# Altium footprint library SparkFun.PCBLIB: 674 footprints (part 26 of 44)
Each footprint in its own frame and in the unit in brackets; x right, y up, seen from the top. Pads: shape width x height; smd on the part's side, far side on the other; paste and mask are expansions set on the pad; w line width, h text height; cw(c..) or ccw(c..) is an arc to the next point about the centre after c.
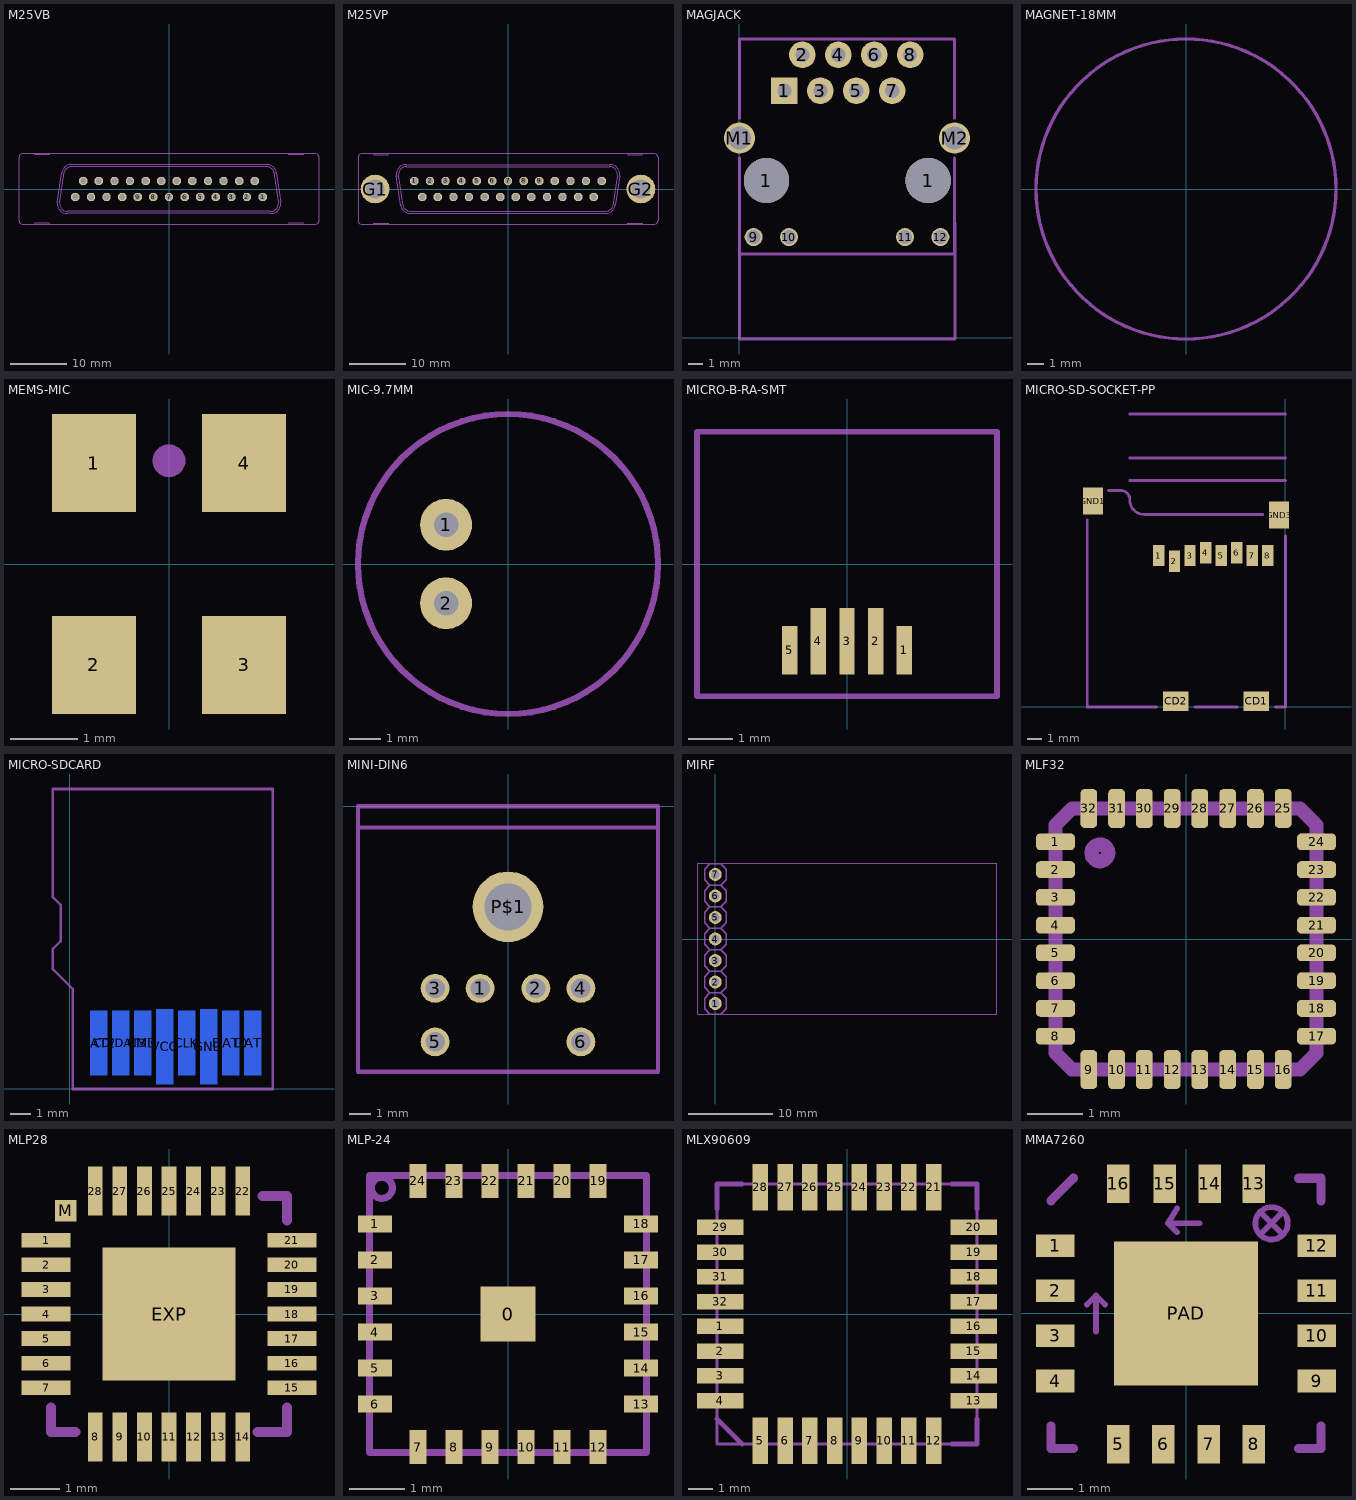
[diagram p25: the footprints below, top view; thin cyan lines are the x and y axes]

## M25VB [mil]
pads (25):
  oct 58.09x58.09 hole 40: 1(652,-56) 2(543,-56) 3(435,-56) 4(326,-56) 5(217,-56) 6(109,-56) 7(0,-56) 8(-109,-56) 9(-217,-56) 10(-326,-56) 11(-435,-56) 12(-543,-56) 13(-652,-56) 14(598,56) 15(489,56) 16(380,56) 17(272,56) 18(163,56) 19(54,56) 20(-54,56) 21(-163,56) 22(-272,56) 23(-380,56) 24(-489,56) 25(-598,56)
Mechanical 2:
  lines w6: -777,-91 -747,113 ; -776.69,-88.67 ccw(c-710,-101.99) -710,-170 710,-170 ccw(c710,-102) 776.68,-88.67 ; -762,-91 -731,115 ; -761.79,-90.7 ccw(c-710,-101.99) -710,-155 710,-155 ccw(c710,-102) 761.97,-91.61 ; -747.89,105.7 cw(c-679.99,102) -680,170 680,170 cw(c680,102) 747.4,110.99 ; -731.52,114.37 cw(c-679.99,102) -680,155 680,155 cw(c680,101.99) 731.3,115.33 ; 731,116 762,-92 ; 746,116 777,-92 ; -935,-245 -1020,-245 cw(c-1020,-220) -1045,-220 -1045,220 cw(c-1020,220) -1020,245 -935,245 ; -935,-245 -935,-240 -835,-240 -835,-245 ; -935,-245 -835,-245 ; -935,245 -835,245 ; -935,245 -935,240 -835,240 -835,245 ; -835,-245 835,-245 ; -835,245 835,245 ; 835,-245 835,-240 935,-240 935,-245 ; 835,-245 935,-245 ; 835,245 935,245 ; 835,245 835,240 935,240 935,245 ; 935,-245 1020,-245 ccw(c1020,-220) 1045,-220 1045,220 ccw(c1020,220) 1020,245 935,245
Mechanical 18:
  circle w16: c109,-56 r10
  circle w16: c163,56 r10
  circle w16: c217,-56 r10
  circle w16: c0,-56 r10
  circle w16: c54,56 r10
  circle w16: c-54,56 r10
  circle w16: c-109,-56 r10
  circle w16: c-217,-56 r10
  circle w16: c-163,56 r10
  circle w16: c-272,56 r10
  circle w16: c-326,-56 r10
  circle w16: c-380,56 r10
  circle w16: c-435,-56 r10
  circle w16: c-489,56 r10
  circle w16: c-543,-56 r10
  circle w16: c-652,-56 r10
  circle w16: c-598,56 r10
  circle w16: c326,-56 r10
  circle w16: c272,56 r10
  circle w16: c380,56 r10
  circle w16: c435,-56 r10
  circle w16: c543,-56 r10
  circle w16: c652,-56 r10
  circle w16: c489,56 r10
  circle w16: c598,56 r10

## M25VP [mil]
pads (27):
  oct 58.09x58.09 hole 40: 1(-652,56) 2(-543,56) 3(-435,56) 4(-326,56) 5(-217,56) 6(-109,56) 7(0,56) 8(109,56) 9(217,56) 10(326,56) 11(435,56) 12(543,56) 13(652,56) 14(-598,-56) 15(-489,-56) 16(-380,-56) 17(-272,-56) 18(-163,-56) 19(-54,-56) 20(54,-56) 21(163,-56) 22(272,-56) 23(380,-56) 24(489,-56) 25(598,-56)
  round 200 hole 130: G1(-926,0) G2(926,0)
Mechanical 2:
  circle w6: c-926,-1 r65
  circle w6: c926,0 r65
  lines w6: -777,92 -746,-116 ; -776.68,88.67 cw(c-710,102) -710,170 710,170 cw(c710,101.99) 776.69,88.67 ; -762,92 -731,-116 ; -761.97,91.61 cw(c-710,102) -710,155 710,155 cw(c710,101.99) 761.79,90.7 ; -747.4,-110.99 ccw(c-680,-102) -680,-170 680,-170 ccw(c679.99,-102) 747.89,-105.7 ; -731.3,-115.33 ccw(c-680,-101.99) -680,-155 680,-155 ccw(c679.99,-102) 731.52,-114.37 ; 731,-115 762,91 ; 747,-113 777,91 ; -935,-245 -935,-240 -835,-240 -835,-245 ; -935,-245 -835,-245 ; -935,-245 -1020,-245 cw(c-1020,-220) -1045,-220 -1045,220 cw(c-1020,220) -1020,245 -935,245 ; -935,245 -935,240 -835,240 -835,245 ; -935,245 -835,245 ; -835,-245 835,-245 ; -835,245 835,245 ; 835,-245 835,-240 935,-240 935,-245 ; 835,-245 935,-245 ; 835,245 835,240 935,240 935,245 ; 835,245 935,245 ; 935,-245 1020,-245 ccw(c1020,-220) 1045,-220 1045,220 ccw(c1020,220) 1020,245 935,245
Mechanical 18:
  circle w16: c-109,56 r10
  circle w16: c-163,-56 r10
  circle w16: c-217,56 r10
  circle w16: c0,56 r10
  circle w16: c-54,-56 r10
  circle w16: c54,-56 r10
  circle w16: c109,56 r10
  circle w16: c217,56 r10
  circle w16: c163,-56 r10
  circle w16: c272,-56 r10
  circle w16: c326,56 r10
  circle w16: c380,-56 r10
  circle w16: c435,56 r10
  circle w16: c489,-56 r10
  circle w16: c543,56 r10
  circle w16: c652,56 r10
  circle w16: c598,-56 r10
  circle w16: c-326,56 r10
  circle w16: c-272,-56 r10
  circle w16: c-380,-56 r10
  circle w16: c-435,56 r10
  circle w16: c-543,56 r10
  circle w16: c-652,56 r10
  circle w16: c-489,-56 r10
  circle w16: c-598,-56 r10

## MAGJACK [mil]
pads (16):
  round 125.98 hole 125.98: 1(75,436.81) 1(525,436.81)
  rect 74x74 hole 39.37: 1(125,686.81)
  round 74 hole 39.37: 2(175,786.81) 3(225,686.81) 4(275,786.81) 5(325,686.81) 6(375,786.81) 7(425,686.81) 8(475,786.81)
  round 50 hole 39.37: 9(39.37,279.53) 10(137.8,279.53) 11(460.63,279.53) 12(559.06,279.53)
  round 86 hole 62.99: M1(0,555.12) M2(598.43,555.12)
Mechanical 2:
  lines w8: 0,232.09 600,232.09 ; 0,236.22 0,500 ; 0,610.24 0,826.77 ; 0,830.51 596.06,830.51 ; 598.43,232.28 598.43,500 ; 598.43,610.24 598.43,830.71
Mechanical 18:
  lines w8: 0,318.7 0,-4.13 600,-4.13 600,318.7

## MAGNET-18MM [mil]
Mechanical 2:
  circle w8: c0,0 r354.33

## MEMS-MIC [mm]
pads (4):
  rect 1.24x1.45 smd: 1(-1.11,1.49) 2(-1.11,-1.49) 3(1.11,-1.49) 4(1.11,1.49)
Mechanical 2:
  circle w0.305: c0,1.524 r0.089

## MIC-9.7MM [mil]
pads (2):
  round 66 hole 31.5: 1(-78.74,50) 2(-78.74,-50)
Mechanical 2:
  circle w8: c0,0 r190.94

## MICRO-B-RA-SMT [mm]
pads (5):
  rect 0.35x1.1 smd: 1(1.3,-1.95) 5(-1.3,-1.95)
  rect 0.35x1.5 smd: 2(0.65,-1.75) 3(0,-1.75) 4(-0.65,-1.75)
Mechanical 18:
  lines w0.127: -3.4,-3 3.4,-3 3.4,3 -3.4,3 -3.4,-3

## MICRO-SD-SOCKET-PP [mil]
pads (12):
  rect 31.5x59.06 smd: 1(-351.97,421.26) 2(-308.66,405.51) 3(-265.35,421.26) 4(-222.05,429.13) 5(-178.74,421.26) 6(-135.43,429.13) 7(-92.13,421.26) 8(-48.82,421.26)
  rect 70.87x55.12 smd: CD1(-80.71,15.75) CD2(-305.12,15.75)
  rect 55.12x74.8 smd: GND1(-535.43,572.83) GND3(-17.72,533.46)
Mechanical 2:
  lines w8: -551.18,519.69 -551.18,0 -358.27,0 ; -492.13,602.36 -460.63,602.36 cw(c-458.66,576.77) -433.07,574.8 ccw(c-392.72,575.78) -393.7,535.43 -62.99,535.43 ; -251.97,0 -133.86,0 ; -27.56,0 0,0 0,476.38
Mechanical 18:
  lines w8: -433.07,629.92 0,629.92 ; -433.07,692.91 0,692.91 ; -433.07,814.96 0,814.96

## MICRO-SDCARD [mm]
pads (8):
  rect 0.85x3.25 smd far side: CD/DAT3(2.56,2.3) CLK(5.86,2.3) CMD(3.66,2.3) DAT0(8.06,2.3) DAT1(9.16,2.3) DAT2(1.46,2.3)
  rect 0.85x3.75 smd far side: GND(6.96,2.1) VCC(4.76,2.1)
Mechanical 2:
  lines w0.127: -0.84,6 -0.84,7 -0.44,7.4 -0.44,9.2 -0.84,9.6 -0.84,15 10.16,15 10.16,0 0.16,0 0.16,5 -0.84,6

## MINI-DIN6 [mm]
pads (7):
  round 1.35 hole 0.9: 1(-1.3,-8.5) 2(1.3,-8.5) 3(-3.4,-8.5) 4(3.4,-8.5) 5(-3.4,-11) 6(3.4,-11)
  round 3.3 hole 2.2: P$1(0,-4.7)
Mechanical 2:
  lines w0.203: -7,-12.4 -7,0 7,0 7,-12.4 -7,-12.4
Mechanical 18:
  lines w0.203: -7,-1 7,-1

## MIRF [mil]
pads (7):
  round 60 hole 40: 1(0,-300) 2(0,-200) 3(0,-100) 4(0,0) 5(0,100) 6(0,200) 7(0,300)
Mechanical 2:
  lines w6: -25,-250 -50,-275 -50,-325 -25,-350 25,-350 50,-325 50,-275 25,-250 ; -25,-250 25,-250 ; -25,-250 -50,-225 -50,-175 -25,-150 ; -25,-150 -50,-125 -50,-75 -25,-50 ; -25,-150 25,-150 ; -25,-50 25,-50 ; -25,-50 -50,-25 -50,25 -25,50 ; -25,50 25,50 ; -25,50 -50,75 -50,125 -25,150 ; -25,150 -50,175 -50,225 -25,250 ; -25,150 25,150 ; -25,250 25,250 ; -25,250 -50,275 -50,325 -25,350 25,350 50,325 50,275 25,250 ; 25,-250 50,-225 50,-175 25,-150 ; 25,-150 50,-125 50,-75 25,-50 ; 25,-50 50,-25 50,25 25,50 ; 25,50 50,75 50,125 25,150 ; 25,150 50,175 50,225 25,250
Mechanical 18:
  region: 10,190 10,210 -10,210 -10,190
  region: 10,90 10,110 -10,110 -10,90
  region: 10,-10 10,10 -10,10 -10,-10
  region: 10,-110 10,-90 -10,-90 -10,-110
  region: 10,-210 10,-190 -10,-190 -10,-210
  region: 10,-310 10,-290 -10,-290 -10,-310
  region: 10,290 10,310 -10,310 -10,290
  lines w5: -85,-350 -85,350 1310,350 1310,-350 -85,-350

## MLF32 [mm]
pads (32):
  rrect50% 0.7x0.3 smd: 1(-2.35,1.75) 2(-2.35,1.25) 3(-2.35,0.75) 4(-2.35,0.25) 5(-2.35,-0.25) 6(-2.35,-0.75) 7(-2.35,-1.25) 8(-2.35,-1.75) 17(2.35,-1.75) 18(2.35,-1.25) 19(2.35,-0.75) 20(2.35,-0.25) 21(2.35,0.25) 22(2.35,0.75) 23(2.35,1.25) 24(2.35,1.75)
  rrect50% 0.3x0.7 smd: 9(-1.75,-2.35) 10(-1.25,-2.35) 11(-0.75,-2.35) 12(-0.25,-2.35) 13(0.25,-2.35) 14(0.75,-2.35) 15(1.25,-2.35) 16(1.75,-2.35) 25(1.75,2.35) 26(1.25,2.35) 27(0.75,2.35) 28(0.25,2.35) 29(-0.25,2.35) 30(-0.75,2.35) 31(-1.25,2.35) 32(-1.75,2.35)
Mechanical 2:
  circle w0.254: c-1.55,1.55 r0.15
  lines w0.254: -2.35,-2.05 -2.05,-2.35 ; -2.35,2.05 -2.05,2.35 ; 2.05,-2.35 2.35,-2.05 ; 2.05,2.35 2.35,2.05
Mechanical 18:
  rectangle: -2.5,1.6 -2.05,1.9
  rectangle: -2.5,1.1 -2.05,1.4
  rectangle: -2.5,0.6 -2.05,0.9
  rectangle: -2.5,0.1 -2.05,0.4
  rectangle: -2.5,-0.4 -2.05,-0.1
  rectangle: -2.5,-0.9 -2.05,-0.6
  rectangle: -2.5,-1.4 -2.05,-1.1
  rectangle: -2.5,-1.9 -2.05,-1.6
  rectangle: -1.9,-2.5 -1.6,-2.05
  rectangle: -1.4,-2.5 -1.1,-2.05
  rectangle: -0.9,-2.5 -0.6,-2.05
  rectangle: -0.4,-2.5 -0.1,-2.05
  rectangle: 0.1,-2.5 0.4,-2.05
  rectangle: 0.6,-2.5 0.9,-2.05
  rectangle: 1.1,-2.5 1.4,-2.05
  rectangle: 1.6,-2.5 1.9,-2.05
  rectangle: 2.05,-1.9 2.5,-1.6
  rectangle: 2.05,-1.4 2.5,-1.1
  rectangle: 2.05,-0.9 2.5,-0.6
  rectangle: 2.05,-0.4 2.5,-0.1
  rectangle: 2.05,0.1 2.5,0.4
  rectangle: 2.05,0.6 2.5,0.9
  rectangle: 2.05,1.1 2.5,1.4
  rectangle: 2.05,1.6 2.5,1.9
  rectangle: 1.6,2.05 1.9,2.5
  rectangle: 1.1,2.05 1.4,2.5
  rectangle: 0.6,2.05 0.9,2.5
  rectangle: 0.1,2.05 0.4,2.5
  rectangle: -0.4,2.05 -0.1,2.5
  rectangle: -0.9,2.05 -0.6,2.5
  rectangle: -1.4,2.05 -1.1,2.5
  rectangle: -1.9,2.05 -1.6,2.5
  lines w0.254: -2.35,-2.05 -2.35,2.05 ; -2.05,-2.35 2.05,-2.35 ; -2.05,2.35 2.05,2.35 ; 2.35,-2.05 2.35,2.05

## MLP28 [mm]
pads (30):
  rect 1x0.3 smd paste-0.5 mask-0.5: 1(-2.5,1.5) 2(-2.5,1) 3(-2.5,0.5) 4(-2.5,0) 5(-2.5,-0.5) 6(-2.5,-1) 7(-2.5,-1.5) 15(2.5,-1.5) 16(2.5,-1) 17(2.5,-0.5) 18(2.5,0) 19(2.5,0.5) 20(2.5,1) 21(2.5,1.5)
  rect 0.3x1 smd paste-0.5 mask-0.5: 8(-1.5,-2.5) 9(-1,-2.5) 10(-0.5,-2.5) 11(0,-2.5) 12(0.5,-2.5) 13(1,-2.5) 14(1.5,-2.5) 22(1.5,2.5) 23(1,2.5) 24(0.5,2.5) 25(0,2.5) 26(-0.5,2.5) 27(-1,2.5) 28(-1.5,2.5)
  rect 2.7x2.7 smd paste-1.35 mask-1.35: EXP(0,0)
  rect 0.435x0.435 smd paste-0.218 mask-0.218: M(-2.103,2.103)
Top Paste:
  rectangle: -2.58,1.37 -2.02,1.63
  rectangle: -0.5,-0.5 0.5,0.5
  rectangle: -2.25,1.95 -1.95,2.25
  rectangle: -2.58,0.87 -2.02,1.13
  rectangle: -2.58,0.37 -2.02,0.63
  rectangle: -2.58,-0.13 -2.02,0.13
  rectangle: -2.58,-0.63 -2.02,-0.37
  rectangle: -2.58,-1.13 -2.02,-0.87
  rectangle: -2.58,-1.63 -2.02,-1.37
  region: 1.37,2.58 1.37,2.02 1.63,2.02 1.63,2.58
  region: 0.87,2.58 0.87,2.02 1.13,2.02 1.13,2.58
  region: 0.37,2.58 0.37,2.02 0.63,2.02 0.63,2.58
  region: -0.13,2.58 -0.13,2.02 0.13,2.02 0.13,2.58
  region: -0.63,2.58 -0.63,2.02 -0.37,2.02 -0.37,2.58
  region: -1.13,2.58 -1.13,2.02 -0.87,2.02 -0.87,2.58
  region: -1.63,2.58 -1.63,2.02 -1.37,2.02 -1.37,2.58
  region: -1.37,-2.58 -1.37,-2.02 -1.63,-2.02 -1.63,-2.58
  region: -0.87,-2.58 -0.87,-2.02 -1.13,-2.02 -1.13,-2.58
  region: -0.37,-2.58 -0.37,-2.02 -0.63,-2.02 -0.63,-2.58
  region: 0.13,-2.58 0.13,-2.02 -0.13,-2.02 -0.13,-2.58
  region: 0.63,-2.58 0.63,-2.02 0.37,-2.02 0.37,-2.58
  region: 1.13,-2.58 1.13,-2.02 0.87,-2.02 0.87,-2.58
  region: 1.63,-2.58 1.63,-2.02 1.37,-2.02 1.37,-2.58
  region: 2.58,-1.37 2.02,-1.37 2.02,-1.63 2.58,-1.63
  region: 2.58,-0.87 2.02,-0.87 2.02,-1.13 2.58,-1.13
  region: 2.58,-0.37 2.02,-0.37 2.02,-0.63 2.58,-0.63
  region: 2.58,0.13 2.02,0.13 2.02,-0.13 2.58,-0.13
  region: 2.58,0.63 2.02,0.63 2.02,0.37 2.58,0.37
  region: 2.58,1.13 2.02,1.13 2.02,0.87 2.58,0.87
  region: 2.58,1.63 2.02,1.63 2.02,1.37 2.58,1.37
Top Solder:
  rectangle: -3.05,1.3 -2,1.7
  rectangle: -2.353,1.852 -1.852,2.353
  rectangle: -3.05,0.8 -2,1.2
  rectangle: -1.5,-1.5 1.5,1.5
  rectangle: -3.05,0.3 -2,0.7
  rectangle: -3.05,-0.2 -2,0.2
  rectangle: -3.05,-0.7 -2,-0.3
  rectangle: -3.05,-1.2 -2,-0.8
  rectangle: -3.05,-1.7 -2,-1.3
  region: 1.3,3.05 1.3,2 1.7,2 1.7,3.05
  region: 0.8,3.05 0.8,2 1.2,2 1.2,3.05
  region: 0.3,3.05 0.3,2 0.7,2 0.7,3.05
  region: -0.2,3.05 -0.2,2 0.2,2 0.2,3.05
  region: -0.7,3.05 -0.7,2 -0.3,2 -0.3,3.05
  region: -1.2,3.05 -1.2,2 -0.8,2 -0.8,3.05
  region: -1.7,3.05 -1.7,2 -1.3,2 -1.3,3.05
  region: -1.3,-3.05 -1.3,-2 -1.7,-2 -1.7,-3.05
  region: -0.8,-3.05 -0.8,-2 -1.2,-2 -1.2,-3.05
  region: -0.3,-3.05 -0.3,-2 -0.7,-2 -0.7,-3.05
  region: 0.2,-3.05 0.2,-2 -0.2,-2 -0.2,-3.05
  region: 0.7,-3.05 0.7,-2 0.3,-2 0.3,-3.05
  region: 1.2,-3.05 1.2,-2 0.8,-2 0.8,-3.05
  region: 1.7,-3.05 1.7,-2 1.3,-2 1.3,-3.05
  region: 3.05,-1.3 2,-1.3 2,-1.7 3.05,-1.7
  region: 3.05,-0.8 2,-0.8 2,-1.2 3.05,-1.2
  region: 3.05,-0.3 2,-0.3 2,-0.7 3.05,-0.7
  region: 3.05,0.2 2,0.2 2,-0.2 3.05,-0.2
  region: 3.05,0.7 2,0.7 2,0.3 3.05,0.3
  region: 3.05,1.2 2,1.2 2,0.8 3.05,0.8
  region: 3.05,1.7 2,1.7 2,1.3 3.05,1.3
Mechanical 2:
  lines w0.203: -2.4,-1.9 -2.4,-2.4 -1.9,-2.4 ; 1.8,-2.4 2.4,-2.4 2.4,-1.9 ; 1.9,2.4 2.4,2.4 2.4,1.9

## MLP-24 [mil]
pads (25):
  rect 39.37x39.37 smd paste-19.68: 0(0,0)
  rect 24x12 smd paste-12: 1(-94.52,63.98) 2(-94.52,38.39) 3(-94.52,12.8) 4(-94.52,-12.8) 5(-94.52,-38.39) 6(-94.52,-63.98) 13(94.52,-63.98) 14(94.52,-38.39) 15(94.52,-12.8) 16(94.52,12.8) 17(94.52,38.39) 18(94.52,63.98)
  rect 12x24 smd paste-12: 7(-63.98,-94.52) 8(-38.39,-94.52) 9(-12.8,-94.52) 10(12.8,-94.52) 11(38.39,-94.52) 12(63.98,-94.52) 19(63.98,94.52) 20(38.39,94.52) 21(12.8,94.52) 22(-12.8,94.52) 23(-38.39,94.52) 24(-63.98,94.52)
Top Paste:
  rectangle: -104,34 -84,42
  rectangle: -104,60 -84,68
  rectangle: -104,9 -84,17
  rectangle: -104,-17 -84,-9
  rectangle: -104,-43 -84,-34
  region: -60,-104 -60,-84 -68,-84 -68,-104
  rectangle: -104,-68 -84,-60
  region: -34,-104 -34,-84 -42,-84 -42,-104
  region: -9,-104 -9,-84 -17,-84 -17,-104
  region: 17,-104 17,-84 9,-84 9,-104
  region: 42,-104 42,-84 34,-84 34,-104
  region: 68,-104 68,-84 60,-84 60,-104
  region: 104,-60 84,-60 84,-68 104,-68
  region: 104,-34.5 84,-34.5 84,-42.5 104,-42.5
  region: 104,-8.5 84,-8.5 84,-16.5 104,-16.5
  region: 104,16.5 84,16.5 84,8.5 104,8.5
  region: 104,42.5 84,42.5 84,34.5 104,34.5
  region: 104,68 84,68 84,60 104,60
  region: 60,104 60,84 68,84 68,104
  region: 34.5,104 34.5,84 42.5,84 42.5,104
  region: 8.5,104 8.5,84 16.5,84 16.5,104
  region: -17,104 -17,84 -9,84 -9,104
  region: -42,104 -42,84 -34,84 -34,104
  region: -68,104 -68,84 -60,84 -60,104
  rectangle: -14.5,-15.5 15.5,15
Mechanical 2:
  circle w5: c-89.57,89.57 r7.49
Mechanical 18:
  lines w5: -98.43,-98.43 98.43,-98.43 98.43,98.43 -98.43,98.43 -98.43,-98.43

## MLX90609 [mil]
pads (32):
  rect 75x25 smd: 1(-205,-20) 2(-205,-60) 3(-205,-100) 4(-205,-140) 13(205,-140) 14(205,-100) 15(205,-60) 16(205,-20) 17(205,20) 18(205,60) 19(205,100) 20(205,140) 29(-205,140) 30(-205,100) 31(-205,60) 32(-205,20)
  rect 25x75 smd: 5(-140,-205) 6(-100,-205) 7(-60,-205) 8(-20,-205) 9(20,-205) 10(60,-205) 11(100,-205) 12(140,-205) 21(140,205) 22(100,205) 23(60,205) 24(20,205) 25(-20,205) 26(-60,205) 27(-100,205) 28(-140,205)
Mechanical 2:
  lines w8: -210,-170 -170,-210 ; -210,170 -210,210 -170,210 ; 170,-210 210,-210 210,-170 ; 170,210 210,210 210,170
Mechanical 18:
  lines w5: -210,-210 210,-210 210,210 -210,210 -210,-210

## MMA7260 [mil]
pads (17):
  rect 33.65x19.69 smd: 1(-114.27,59.06) 2(-114.27,19.69) 3(-114.27,-19.69) 4(-114.27,-59.06) 9(114.27,-59.06) 10(114.27,-19.69) 11(114.27,19.69) 12(114.27,59.06)
  rect 19.69x33.65 smd: 5(-59.06,-114.27) 6(-19.69,-114.27) 7(19.69,-114.27) 8(59.06,-114.27) 13(59.06,113.27) 14(20.69,113.27) 15(-18.69,113.27) 16(-59.06,113.27)
  rect 125.98x125.98 smd paste-62.99: PAD(0,0)
Top Paste:
  rectangle: -14.76,-14.76 14.76,14.76
Mechanical 2:
  lines w8: -118.11,-98.43 -118.11,-118.11 -98.43,-118.11 ; -118.11,98.43 -98.43,118.11 ; 98.43,-118.11 118.11,-118.11 118.11,-98.43 ; 98.43,118.11 118.11,118.11 118.11,98.43
Mechanical 18:
  circle w5: c74.8,78.74 r14.19
  lines w5: -86.61,7.87 -78.74,15.75 ; -78.74,-15.75 -78.74,15.75 ; -70.87,7.87 -78.74,15.75 ; -7.87,70.87 -15.75,78.74 ; -7.87,91.61 -15.75,78.74 ; 11.81,78.74 -15.75,78.74 ; 66.93,70.87 82.68,86.61 ; 66.93,86.61 82.68,70.87